# Altium integrated library ALTIUM-WR-FPC-rev18c.IntLib: 212 symbols (part 1 of 2)
Pins are listed as number, name and electrical type; pins without a type are passive.

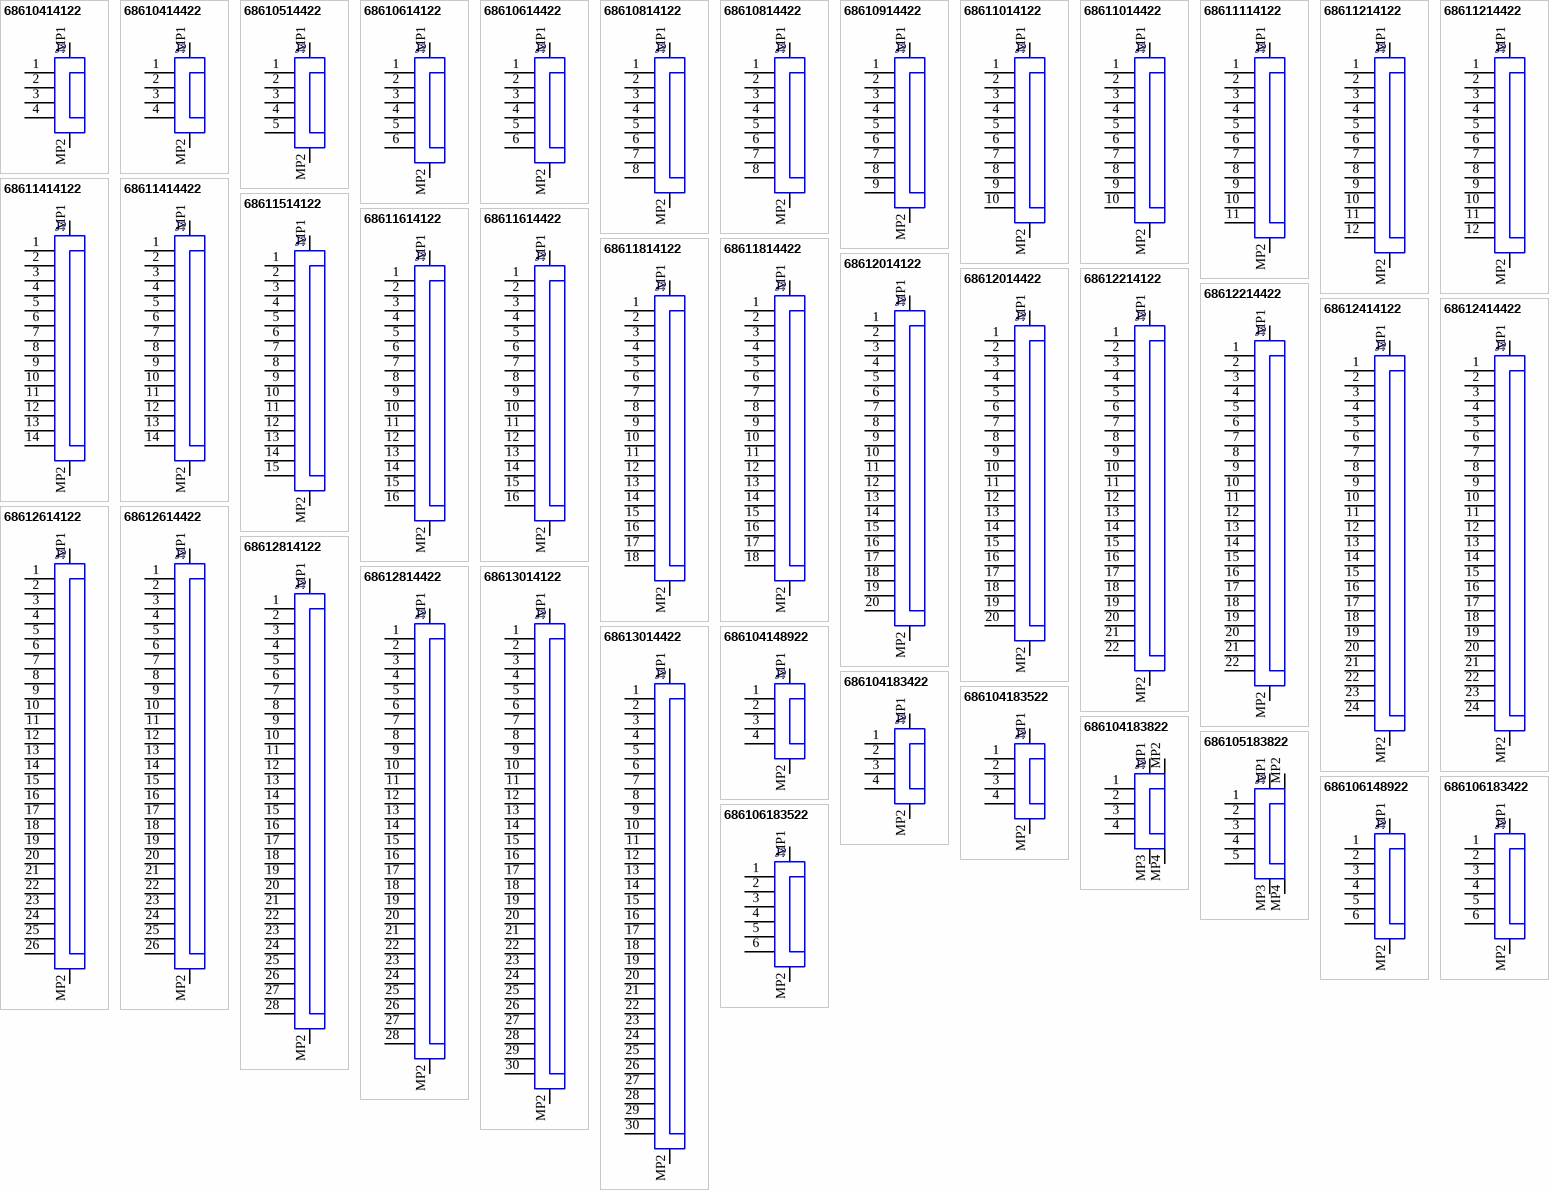
[diagram p0: symbols 68610414122 to 686106183522]

## 68610414122
designator J?
SMT ZIF Connectors WR-FPC, Horizontal, Top Contact, pitch 1 mm, 4 pins; Part Number: 68610414122; Rated Current: 1 A; Contact Resistance: 20 mOhm; Withstanding Voltage: 500 VAC; Working Voltage: 125 VAC; Pin Number: 4; Pitch: 1 mm; ComponentLink1Description: Manufacturer; ComponentLink1URL: http://www.we-online.de; ComponentLink2Description: Datasheet; ComponentLink2URL: https://katalog.we-online.de/em/datasheet/68610414122.pdf; Published Date: August 2018; Publisher: Wurth Elektronik; Operating Temperature: -25 to 85 degC; Packaging: Tape and Reel; Mounting Technology: SMT; Orientation: Horizontal; Contact Design: Top Contact
footprint 68610414122
pins: 1, 2, 3, 4, MP1, MP2

## 68610414422
designator J?
SMT ZIF Connectors WR-FPC, Horizontal, Bottom Contact, pitch 1 mm, 4 pins; Part Number: 68610414422; Rated Current: 1 A; Contact Resistance: 20 mOhm; Withstanding Voltage: 500 VAC; Working Voltage: 125 VAC; Pin Number: 4; Pitch: 1 mm; ComponentLink1Description: Manufacturer; ComponentLink1URL: http://www.we-online.de; ComponentLink2Description: Datasheet; ComponentLink2URL: https://katalog.we-online.de/em/datasheet/68610414422.pdf; Published Date: August 2018; Publisher: Wurth Elektronik; Operating Temperature: -25 to 85 degC; Packaging: Tape and Reel; Mounting Technology: SMT; Orientation: Horizontal; Contact Design: Bottom Contact
footprint 68610414422
pins: 1, 2, 3, 4, MP1, MP2

## 68610514422
designator J?
SMT ZIF Connectors WR-FPC, Horizontal, Bottom Contact, pitch 1 mm, 5 pins; Part Number: 68610514422; Rated Current: 1 A; Contact Resistance: 20 mOhm; Withstanding Voltage: 500 VAC; Working Voltage: 125 VAC; Pin Number: 5; Pitch: 1 mm; ComponentLink1Description: Manufacturer; ComponentLink1URL: http://www.we-online.de; ComponentLink2Description: Datasheet; ComponentLink2URL: https://katalog.we-online.de/em/datasheet/68610514422.pdf; Published Date: August 2018; Publisher: Wurth Elektronik; Operating Temperature: -25 to 85 degC; Packaging: Tape and Reel; Mounting Technology: SMT; Orientation: Horizontal; Contact Design: Bottom Contact
footprint 68610514422
pins: 1, 2, 3, 4, 5, MP1, MP2

## 68610614122
designator J?
SMT ZIF Connectors WR-FPC, Horizontal, Top Contact, pitch 1 mm, 6 pins; Part Number: 68610614122; Rated Current: 1 A; Contact Resistance: 20 mOhm; Withstanding Voltage: 500 VAC; Working Voltage: 125 VAC; Pin Number: 6; Pitch: 1 mm; ComponentLink1Description: Manufacturer; ComponentLink1URL: http://www.we-online.de; ComponentLink2Description: Datasheet; ComponentLink2URL: https://katalog.we-online.de/em/datasheet/68610614122.pdf; Published Date: August 2018; Publisher: Wurth Elektronik; Operating Temperature: -25 to 85 degC; Packaging: Tape and Reel; Mounting Technology: SMT; Orientation: Horizontal; Contact Design: Top Contact
footprint 68610614122
pins: 1, 2, 3, 4, 5, 6, MP1, MP2

## 68610614422
designator J?
SMT ZIF Connectors WR-FPC, Horizontal, Bottom Contact, pitch 1 mm, 6 pins; Part Number: 68610614422; Rated Current: 1 A; Contact Resistance: 20 mOhm; Withstanding Voltage: 500 VAC; Working Voltage: 125 VAC; Pin Number: 6; Pitch: 1 mm; ComponentLink1Description: Manufacturer; ComponentLink1URL: http://www.we-online.de; ComponentLink2Description: Datasheet; ComponentLink2URL: https://katalog.we-online.de/em/datasheet/68610614422.pdf; Published Date: August 2018; Publisher: Wurth Elektronik; Operating Temperature: -25 to 85 degC; Packaging: Tape and Reel; Mounting Technology: SMT; Orientation: Horizontal; Contact Design: Bottom Contact
footprint 68610614422
pins: 1, 2, 3, 4, 5, 6, MP1, MP2

## 68610814122
designator J?
SMT ZIF Connectors WR-FPC, Horizontal, Top Contact, pitch 1 mm, 8 pins; Part Number: 68610814122; Rated Current: 1 A; Contact Resistance: 20 mOhm; Withstanding Voltage: 500 VAC; Working Voltage: 125 VAC; Pin Number: 8; Pitch: 1 mm; ComponentLink1Description: Manufacturer; ComponentLink1URL: http://www.we-online.de; ComponentLink2Description: Datasheet; ComponentLink2URL: https://katalog.we-online.de/em/datasheet/68610814122.pdf; Published Date: August 2018; Publisher: Wurth Elektronik; Operating Temperature: -25 to 85 degC; Packaging: Tape and Reel; Mounting Technology: SMT; Orientation: Horizontal; Contact Design: Top Contact
footprint 68610814122
pins: 1, 2, 3, 4, 5, 6, 7, 8, MP1, MP2

## 68610814422
designator J?
SMT ZIF Connectors WR-FPC, Horizontal, Bottom Contact, pitch 1 mm, 8 pins; Part Number: 68610814422; Rated Current: 1 A; Contact Resistance: 20 mOhm; Withstanding Voltage: 500 VAC; Working Voltage: 125 VAC; Pin Number: 8; Pitch: 1 mm; ComponentLink1Description: Manufacturer; ComponentLink1URL: http://www.we-online.de; ComponentLink2Description: Datasheet; ComponentLink2URL: https://katalog.we-online.de/em/datasheet/68610814422.pdf; Published Date: August 2018; Publisher: Wurth Elektronik; Operating Temperature: -25 to 85 degC; Packaging: Tape and Reel; Mounting Technology: SMT; Orientation: Horizontal; Contact Design: Bottom Contact
footprint 68610814422
pins: 1, 2, 3, 4, 5, 6, 7, 8, MP1, MP2

## 68610914422
designator J?
SMT ZIF Connectors WR-FPC, Horizontal, Bottom Contact, pitch 1 mm, 9 pins; Part Number: 68610914422; Rated Current: 1 A; Contact Resistance: 20 mOhm; Withstanding Voltage: 500 VAC; Working Voltage: 125 VAC; Pin Number: 9; Pitch: 1 mm; ComponentLink1Description: Manufacturer; ComponentLink1URL: http://www.we-online.de; ComponentLink2Description: Datasheet; ComponentLink2URL: https://katalog.we-online.de/em/datasheet/68610914422.pdf; Published Date: August 2018; Publisher: Wurth Elektronik; Operating Temperature: -25 to 85 degC; Packaging: Tape and Reel; Mounting Technology: SMT; Orientation: Horizontal; Contact Design: Bottom Contact
footprint 68610914422
pins: 1, 2, 3, 4, 5, 6, 7, 8, 9, MP1, MP2

## 68611014122
designator J?
SMT ZIF Connectors WR-FPC, Horizontal, Top Contact, pitch 1 mm, 10 pins; Part Number: 68611014122; Rated Current: 1 A; Contact Resistance: 20 mOhm; Withstanding Voltage: 500 VAC; Working Voltage: 125 VAC; Pin Number: 10; Pitch: 1 mm; ComponentLink1Description: Manufacturer; ComponentLink1URL: http://www.we-online.de; ComponentLink2Description: Datasheet; ComponentLink2URL: https://katalog.we-online.de/em/datasheet/68611014122.pdf; Published Date: August 2018; Publisher: Wurth Elektronik; Operating Temperature: -25 to 85 degC; Packaging: Tape and Reel; Mounting Technology: SMT; Orientation: Horizontal; Contact Design: Top Contact
footprint 68611014122
pins: 1, 2, 3, 4, 5, 6, 7, 8, 9, 10, MP1, MP2

## 68611014422
designator J?
SMT ZIF Connectors WR-FPC, Horizontal, Bottom Contact, pitch 1 mm, 10 pins; Part Number: 68611014422; Rated Current: 1 A; Contact Resistance: 20 mOhm; Withstanding Voltage: 500 VAC; Working Voltage: 125 VAC; Pin Number: 10; Pitch: 1 mm; ComponentLink1Description: Manufacturer; ComponentLink1URL: http://www.we-online.de; ComponentLink2Description: Datasheet; ComponentLink2URL: https://katalog.we-online.de/em/datasheet/68611014422.pdf; Published Date: August 2018; Publisher: Wurth Elektronik; Operating Temperature: -25 to 85 degC; Packaging: Tape and Reel; Mounting Technology: SMT; Orientation: Horizontal; Contact Design: Bottom Contact
footprint 68611014422
pins: 1, 2, 3, 4, 5, 6, 7, 8, 9, 10, MP1, MP2

## 68611114122
designator J?
SMT ZIF Connectors WR-FPC, Horizontal, Top Contact, pitch 1 mm, 11 pins; Part Number: 68611114122; Rated Current: 1 A; Contact Resistance: 20 mOhm; Withstanding Voltage: 500 VAC; Working Voltage: 125 VAC; Pin Number: 11; Pitch: 1 mm; ComponentLink1Description: Manufacturer; ComponentLink1URL: http://www.we-online.de; ComponentLink2Description: Datasheet; ComponentLink2URL: https://katalog.we-online.de/em/datasheet/68611114122.pdf; Published Date: August 2018; Publisher: Wurth Elektronik; Operating Temperature: -25 to 85 degC; Packaging: Tape and Reel; Mounting Technology: SMT; Orientation: Horizontal; Contact Design: Top Contact
footprint 68611114122
pins: 1, 2, 3, 4, 5, 6, 7, 8, 9, 10, 11, MP1, MP2

## 68611214122
designator J?
SMT ZIF Connectors WR-FPC, Horizontal, Top Contact, pitch 1 mm, 12 pins; Part Number: 68611214122; Rated Current: 1 A; Contact Resistance: 20 mOhm; Withstanding Voltage: 500 VAC; Working Voltage: 125 VAC; Pin Number: 12; Pitch: 1 mm; ComponentLink1Description: Manufacturer; ComponentLink1URL: http://www.we-online.de; ComponentLink2Description: Datasheet; ComponentLink2URL: https://katalog.we-online.de/em/datasheet/68611214122.pdf; Published Date: August 2018; Publisher: Wurth Elektronik; Operating Temperature: -25 to 85 degC; Packaging: Tape and Reel; Mounting Technology: SMT; Orientation: Horizontal; Contact Design: Top Contact
footprint 68611214122
pins: 1, 2, 3, 4, 5, 6, 7, 8, 9, 10, 11, 12, MP1, MP2

## 68611214422
designator J?
SMT ZIF Connectors WR-FPC, Horizontal, Bottom Contact, pitch 1 mm, 12 pins; Part Number: 68611214422; Rated Current: 1 A; Contact Resistance: 20 mOhm; Withstanding Voltage: 500 VAC; Working Voltage: 125 VAC; Pin Number: 12; Pitch: 1 mm; ComponentLink1Description: Manufacturer; ComponentLink1URL: http://www.we-online.de; ComponentLink2Description: Datasheet; ComponentLink2URL: https://katalog.we-online.de/em/datasheet/68611214422.pdf; Published Date: August 2018; Publisher: Wurth Elektronik; Operating Temperature: -25 to 85 degC; Packaging: Tape and Reel; Mounting Technology: SMT; Orientation: Horizontal; Contact Design: Bottom Contact
footprint 68611214422
pins: 1, 2, 3, 4, 5, 6, 7, 8, 9, 10, 11, 12, MP1, MP2

## 68611414122
designator J?
SMT ZIF Connectors WR-FPC, Horizontal, Top Contact, pitch 1 mm, 14 pins; Part Number: 68611414122; Rated Current: 1 A; Contact Resistance: 20 mOhm; Withstanding Voltage: 500 VAC; Working Voltage: 125 VAC; Pin Number: 14; Pitch: 1 mm; ComponentLink1Description: Manufacturer; ComponentLink1URL: http://www.we-online.de; ComponentLink2Description: Datasheet; ComponentLink2URL: https://katalog.we-online.de/em/datasheet/68611414122.pdf; Published Date: August 2018; Publisher: Wurth Elektronik; Operating Temperature: -25 to 85 degC; Packaging: Tape and Reel; Mounting Technology: SMT; Orientation: Horizontal; Contact Design: Top Contact
footprint 68611414122
pins: 1, 2, 3, 4, 5, 6, 7, 8, 9, 10, 11, 12, 13, 14, MP1, MP2

## 68611414422
designator J?
SMT ZIF Connectors WR-FPC, Horizontal, Bottom Contact, pitch 1 mm, 14 pins; Part Number: 68611414422; Rated Current: 1 A; Contact Resistance: 20 mOhm; Withstanding Voltage: 500 VAC; Working Voltage: 125 VAC; Pin Number: 14; Pitch: 1 mm; ComponentLink1Description: Manufacturer; ComponentLink1URL: http://www.we-online.de; ComponentLink2Description: Datasheet; ComponentLink2URL: https://katalog.we-online.de/em/datasheet/68611414422.pdf; Published Date: August 2018; Publisher: Wurth Elektronik; Operating Temperature: -25 to 85 degC; Packaging: Tape and Reel; Mounting Technology: SMT; Orientation: Horizontal; Contact Design: Bottom Contact
footprint 68611414422
pins: 1, 2, 3, 4, 5, 6, 7, 8, 9, 10, 11, 12, 13, 14, MP1, MP2

## 68611514122
designator J?
SMT ZIF Connectors WR-FPC, Horizontal, Top Contact, pitch 1 mm, 15 pins; Part Number: 68611514122; Rated Current: 1 A; Contact Resistance: 20 mOhm; Withstanding Voltage: 500 VAC; Working Voltage: 125 VAC; Pin Number: 15; Pitch: 1 mm; ComponentLink1Description: Manufacturer; ComponentLink1URL: http://www.we-online.de; ComponentLink2Description: Datasheet; ComponentLink2URL: https://katalog.we-online.de/em/datasheet/68611514122.pdf; Published Date: August 2018; Publisher: Wurth Elektronik; Operating Temperature: -25 to 85 degC; Packaging: Tape and Reel; Mounting Technology: SMT; Orientation: Horizontal; Contact Design: Top Contact
footprint 68611514122
pins: 1, 2, 3, 4, 5, 6, 7, 8, 9, 10, 11, 12, 13, 14, 15, MP1, MP2

## 68611614122
designator J?
SMT ZIF Connectors WR-FPC, Horizontal, Top Contact, pitch 1 mm, 16 pins; Part Number: 68611614122; Rated Current: 1 A; Contact Resistance: 20 mOhm; Withstanding Voltage: 500 VAC; Working Voltage: 125 VAC; Pin Number: 16; Pitch: 1 mm; ComponentLink1Description: Manufacturer; ComponentLink1URL: http://www.we-online.de; ComponentLink2Description: Datasheet; ComponentLink2URL: https://katalog.we-online.de/em/datasheet/68611614122.pdf; Published Date: August 2018; Publisher: Wurth Elektronik; Operating Temperature: -25 to 85 degC; Packaging: Tape and Reel; Mounting Technology: SMT; Orientation: Horizontal; Contact Design: Top Contact
footprint 68611614122
pins: 1, 2, 3, 4, 5, 6, 7, 8, 9, 10, 11, 12, 13, 14, 15, 16, MP1, MP2

## 68611614422
designator J?
SMT ZIF Connectors WR-FPC, Horizontal, Bottom Contact, pitch 1 mm, 16 pins; Part Number: 68611614422; Rated Current: 1 A; Contact Resistance: 20 mOhm; Withstanding Voltage: 500 VAC; Working Voltage: 125 VAC; Pin Number: 16; Pitch: 1 mm; ComponentLink1Description: Manufacturer; ComponentLink1URL: http://www.we-online.de; ComponentLink2Description: Datasheet; ComponentLink2URL: https://katalog.we-online.de/em/datasheet/68611614422.pdf; Published Date: August 2018; Publisher: Wurth Elektronik; Operating Temperature: -25 to 85 degC; Packaging: Tape and Reel; Mounting Technology: SMT; Orientation: Horizontal; Contact Design: Bottom Contact
footprint 68611614422
pins: 1, 2, 3, 4, 5, 6, 7, 8, 9, 10, 11, 12, 13, 14, 15, 16, MP1, MP2

## 68611814122
designator J?
SMT ZIF Connectors WR-FPC, Horizontal, Top Contact, pitch 1 mm, 18 pins; Part Number: 68611814122; Rated Current: 1 A; Contact Resistance: 20 mOhm; Withstanding Voltage: 500 VAC; Working Voltage: 125 VAC; Pin Number: 18; Pitch: 1 mm; ComponentLink1Description: Manufacturer; ComponentLink1URL: http://www.we-online.de; ComponentLink2Description: Datasheet; ComponentLink2URL: https://katalog.we-online.de/em/datasheet/68611814122.pdf; Published Date: August 2018; Publisher: Wurth Elektronik; Operating Temperature: -25 to 85 degC; Packaging: Tape and Reel; Mounting Technology: SMT; Orientation: Horizontal; Contact Design: Top Contact
footprint 68611814122
pins: 1, 2, 3, 4, 5, 6, 7, 8, 9, 10, 11, 12, 13, 14, 15, 16, 17, 18, MP1, MP2

## 68611814422
designator J?
SMT ZIF Connectors WR-FPC, Horizontal, Bottom Contact, pitch 1 mm, 18 pins; Part Number: 68611814422; Rated Current: 1 A; Contact Resistance: 20 mOhm; Withstanding Voltage: 500 VAC; Working Voltage: 125 VAC; Pin Number: 18; Pitch: 1 mm; ComponentLink1Description: Manufacturer; ComponentLink1URL: http://www.we-online.de; ComponentLink2Description: Datasheet; ComponentLink2URL: https://katalog.we-online.de/em/datasheet/68611814422.pdf; Published Date: August 2018; Publisher: Wurth Elektronik; Operating Temperature: -25 to 85 degC; Packaging: Tape and Reel; Mounting Technology: SMT; Orientation: Horizontal; Contact Design: Bottom Contact
footprint 68611814422
pins: 1, 2, 3, 4, 5, 6, 7, 8, 9, 10, 11, 12, 13, 14, 15, 16, 17, 18, MP1, MP2

## 68612014122
designator J?
SMT ZIF Connectors WR-FPC, Horizontal, Top Contact, pitch 1 mm, 20 pins; Part Number: 68612014122; Rated Current: 1 A; Contact Resistance: 20 mOhm; Withstanding Voltage: 500 VAC; Working Voltage: 125 VAC; Pin Number: 20; Pitch: 1 mm; ComponentLink1Description: Manufacturer; ComponentLink1URL: http://www.we-online.de; ComponentLink2Description: Datasheet; ComponentLink2URL: https://katalog.we-online.de/em/datasheet/68612014122.pdf; Published Date: August 2018; Publisher: Wurth Elektronik; Operating Temperature: -25 to 85 degC; Packaging: Tape and Reel; Mounting Technology: SMT; Orientation: Horizontal; Contact Design: Top Contact
footprint 68612014122
pins: 1, 2, 3, 4, 5, 6, 7, 8, 9, 10, 11, 12, 13, 14, 15, 16, 17, 18, 19, 20, MP1, MP2

## 68612014422
designator J?
SMT ZIF Connectors WR-FPC, Horizontal, Bottom Contact, pitch 1 mm, 20 pins; Part Number: 68612014422; Rated Current: 1 A; Contact Resistance: 20 mOhm; Withstanding Voltage: 500 VAC; Working Voltage: 125 VAC; Pin Number: 20; Pitch: 1 mm; ComponentLink1Description: Manufacturer; ComponentLink1URL: http://www.we-online.de; ComponentLink2Description: Datasheet; ComponentLink2URL: https://katalog.we-online.de/em/datasheet/68612014422.pdf; Published Date: August 2018; Publisher: Wurth Elektronik; Operating Temperature: -25 to 85 degC; Packaging: Tape and Reel; Mounting Technology: SMT; Orientation: Horizontal; Contact Design: Bottom Contact
footprint 68612014422
pins: 1, 2, 3, 4, 5, 6, 7, 8, 9, 10, 11, 12, 13, 14, 15, 16, 17, 18, 19, 20, MP1, MP2

## 68612214122
designator J?
SMT ZIF Connectors WR-FPC, Horizontal, Top Contact, pitch 1 mm, 22 pins; Part Number: 68612214122; Rated Current: 1 A; Contact Resistance: 20 mOhm; Withstanding Voltage: 500 VAC; Working Voltage: 125 VAC; Pin Number: 22; Pitch: 1 mm; ComponentLink1Description: Manufacturer; ComponentLink1URL: http://www.we-online.de; ComponentLink2Description: Datasheet; ComponentLink2URL: https://katalog.we-online.de/em/datasheet/68612214122.pdf; Published Date: August 2018; Publisher: Wurth Elektronik; Operating Temperature: -25 to 85 degC; Packaging: Tape and Reel; Mounting Technology: SMT; Orientation: Horizontal; Contact Design: Top Contact
footprint 68612214122
pins: 1, 2, 3, 4, 5, 6, 7, 8, 9, 10, 11, 12, 13, 14, 15, 16, 17, 18, 19, 20, 21, 22, MP1, MP2

## 68612214422
designator J?
SMT ZIF Connectors WR-FPC, Horizontal, Bottom Contact, pitch 1 mm, 22 pins; Part Number: 68612214422; Rated Current: 1 A; Contact Resistance: 20 mOhm; Withstanding Voltage: 500 VAC; Working Voltage: 125 VAC; Pin Number: 22; Pitch: 1 mm; ComponentLink1Description: Manufacturer; ComponentLink1URL: http://www.we-online.de; ComponentLink2Description: Datasheet; ComponentLink2URL: https://katalog.we-online.de/em/datasheet/68612214422.pdf; Published Date: August 2018; Publisher: Wurth Elektronik; Operating Temperature: -25 to 85 degC; Packaging: Tape and Reel; Mounting Technology: SMT; Orientation: Horizontal; Contact Design: Bottom Contact
footprint 68612214422
pins: 1, 2, 3, 4, 5, 6, 7, 8, 9, 10, 11, 12, 13, 14, 15, 16, 17, 18, 19, 20, 21, 22, MP1, MP2

## 68612414122
designator J?
SMT ZIF Connectors WR-FPC, Horizontal, Top Contact, pitch 1 mm, 24 pins; Part Number: 68612414122; Rated Current: 1 A; Contact Resistance: 20 mOhm; Withstanding Voltage: 500 VAC; Working Voltage: 125 VAC; Pin Number: 24; Pitch: 1 mm; ComponentLink1Description: Manufacturer; ComponentLink1URL: http://www.we-online.de; ComponentLink2Description: Datasheet; ComponentLink2URL: https://katalog.we-online.de/em/datasheet/68612414122.pdf; Published Date: August 2018; Publisher: Wurth Elektronik; Operating Temperature: -25 to 85 degC; Packaging: Tape and Reel; Mounting Technology: SMT; Orientation: Horizontal; Contact Design: Top Contact
footprint 68612414122
pins: 1, 2, 3, 4, 5, 6, 7, 8, 9, 10, 11, 12, 13, 14, 15, 16, 17, 18, 19, 20, 21, 22, 23, 24, MP1, MP2

## 68612414422
designator J?
SMT ZIF Connectors WR-FPC, Horizontal, Bottom Contact, pitch 1 mm, 24 pins; Part Number: 68612414422; Rated Current: 1 A; Contact Resistance: 20 mOhm; Withstanding Voltage: 500 VAC; Working Voltage: 125 VAC; Pin Number: 24; Pitch: 1 mm; ComponentLink1Description: Manufacturer; ComponentLink1URL: http://www.we-online.de; ComponentLink2Description: Datasheet; ComponentLink2URL: https://katalog.we-online.de/em/datasheet/68612414422.pdf; Published Date: August 2018; Publisher: Wurth Elektronik; Operating Temperature: -25 to 85 degC; Packaging: Tape and Reel; Mounting Technology: SMT; Orientation: Horizontal; Contact Design: Bottom Contact
footprint 68612414422
pins: 1, 2, 3, 4, 5, 6, 7, 8, 9, 10, 11, 12, 13, 14, 15, 16, 17, 18, 19, 20, 21, 22, 23, 24, MP1, MP2

## 68612614122
designator J?
SMT ZIF Connectors WR-FPC, Horizontal, Top Contact, pitch 1 mm, 26 pins; Part Number: 68612614122; Rated Current: 1 A; Contact Resistance: 20 mOhm; Withstanding Voltage: 500 VAC; Working Voltage: 125 VAC; Pin Number: 26; Pitch: 1 mm; ComponentLink1Description: Manufacturer; ComponentLink1URL: http://www.we-online.de; ComponentLink2Description: Datasheet; ComponentLink2URL: https://katalog.we-online.de/em/datasheet/68612614122.pdf; Published Date: August 2018; Publisher: Wurth Elektronik; Operating Temperature: -25 to 85 degC; Packaging: Tape and Reel; Mounting Technology: SMT; Orientation: Horizontal; Contact Design: Top Contact
footprint 68612614122
pins: 1, 2, 3, 4, 5, 6, 7, 8, 9, 10, 11, 12, 13, 14, 15, 16, 17, 18, 19, 20, 21, 22, 23, 24, 25, 26, MP1, MP2

## 68612614422
designator J?
SMT ZIF Connectors WR-FPC, Horizontal, Bottom Contact, pitch 1 mm, 26 pins; Part Number: 68612614422; Rated Current: 1 A; Contact Resistance: 20 mOhm; Withstanding Voltage: 500 VAC; Working Voltage: 125 VAC; Pin Number: 26; Pitch: 1 mm; ComponentLink1Description: Manufacturer; ComponentLink1URL: http://www.we-online.de; ComponentLink2Description: Datasheet; ComponentLink2URL: https://katalog.we-online.de/em/datasheet/68612614422.pdf; Published Date: August 2018; Publisher: Wurth Elektronik; Operating Temperature: -25 to 85 degC; Packaging: Tape and Reel; Mounting Technology: SMT; Orientation: Horizontal; Contact Design: Bottom Contact
footprint 68612614422
pins: 1, 2, 3, 4, 5, 6, 7, 8, 9, 10, 11, 12, 13, 14, 15, 16, 17, 18, 19, 20, 21, 22, 23, 24, 25, 26, MP1, MP2

## 68612814122
designator J?
SMT ZIF Connectors WR-FPC, Horizontal, Top Contact, pitch 1 mm, 28 pins; Part Number: 68612814122; Rated Current: 1 A; Contact Resistance: 20 mOhm; Withstanding Voltage: 500 VAC; Working Voltage: 125 VAC; Pin Number: 28; Pitch: 1 mm; ComponentLink1Description: Manufacturer; ComponentLink1URL: http://www.we-online.de; ComponentLink2Description: Datasheet; ComponentLink2URL: https://katalog.we-online.de/em/datasheet/68612814122.pdf; Published Date: August 2018; Publisher: Wurth Elektronik; Operating Temperature: -25 to 85 degC; Packaging: Tape and Reel; Mounting Technology: SMT; Orientation: Horizontal; Contact Design: Top Contact
footprint 68612814122
pins: 1, 2, 3, 4, 5, 6, 7, 8, 9, 10, 11, 12, 13, 14, 15, 16, 17, 18, 19, 20, 21, 22, 23, 24, 25, 26, 27, 28, MP1, MP2

## 68612814422
designator J?
SMT ZIF Connectors WR-FPC, Horizontal, Bottom Contact, pitch 1 mm, 28 pins; Part Number: 68612814422; Rated Current: 1 A; Contact Resistance: 20 mOhm; Withstanding Voltage: 500 VAC; Working Voltage: 125 VAC; Pin Number: 28; Pitch: 1 mm; ComponentLink1Description: Manufacturer; ComponentLink1URL: http://www.we-online.de; ComponentLink2Description: Datasheet; ComponentLink2URL: https://katalog.we-online.de/em/datasheet/68612814422.pdf; Published Date: August 2018; Publisher: Wurth Elektronik; Operating Temperature: -25 to 85 degC; Packaging: Tape and Reel; Mounting Technology: SMT; Orientation: Horizontal; Contact Design: Bottom Contact
footprint 68612814422
pins: 1, 2, 3, 4, 5, 6, 7, 8, 9, 10, 11, 12, 13, 14, 15, 16, 17, 18, 19, 20, 21, 22, 23, 24, 25, 26, 27, 28, MP1, MP2

## 68613014122
designator J?
SMT ZIF Connectors WR-FPC, Horizontal, Top Contact, pitch 1 mm, 30 pins; Part Number: 68613014122; Rated Current: 1 A; Contact Resistance: 20 mOhm; Withstanding Voltage: 500 VAC; Working Voltage: 125 VAC; Pin Number: 30; Pitch: 1 mm; ComponentLink1Description: Manufacturer; ComponentLink1URL: http://www.we-online.de; ComponentLink2Description: Datasheet; ComponentLink2URL: https://katalog.we-online.de/em/datasheet/68613014122.pdf; Published Date: August 2018; Publisher: Wurth Elektronik; Operating Temperature: -25 to 85 degC; Packaging: Tape and Reel; Mounting Technology: SMT; Orientation: Horizontal; Contact Design: Top Contact
footprint 68613014122
pins: 1, 2, 3, 4, 5, 6, 7, 8, 9, 10, 11, 12, 13, 14, 15, 16, 17, 18, 19, 20, 21, 22, 23, 24, 25, 26, 27, 28, 29, 30, MP1, MP2

## 68613014422
designator J?
SMT ZIF Connectors WR-FPC, Horizontal, Bottom Contact, pitch 1 mm, 30 pins; Part Number: 68613014422; Rated Current: 1 A; Contact Resistance: 20 mOhm; Withstanding Voltage: 500 VAC; Working Voltage: 125 VAC; Pin Number: 30; Pitch: 1 mm; ComponentLink1Description: Manufacturer; ComponentLink1URL: http://www.we-online.de; ComponentLink2Description: Datasheet; ComponentLink2URL: https://katalog.we-online.de/em/datasheet/68613014422.pdf; Published Date: August 2018; Publisher: Wurth Elektronik; Operating Temperature: -25 to 85 degC; Packaging: Tape and Reel; Mounting Technology: SMT; Orientation: Horizontal; Contact Design: Bottom Contact
footprint 68613014422
pins: 1, 2, 3, 4, 5, 6, 7, 8, 9, 10, 11, 12, 13, 14, 15, 16, 17, 18, 19, 20, 21, 22, 23, 24, 25, 26, 27, 28, 29, 30, MP1, MP2

## 686104148922
designator J?
SMT ZIF Connectors Hinge Type WR-FPC, Horizontal, Bottom Contact, pitch 1 mm, 4 pins; Part Number: 686104148922; Rated Current: 1 A; Contact Resistance: 50 mOhm; Withstanding Voltage: 500 VAC; Working Voltage: 100 VAC; Pin Number: 4; Pitch: 1 mm; ComponentLink1Description: Manufacturer; ComponentLink1URL: http://www.we-online.de; ComponentLink2Description: Datasheet; ComponentLink2URL: https://katalog.we-online.de/em/datasheet/686104148922.pdf; Published Date: August 2018; Publisher: Wurth Elektronik; Operating Temperature: -40 to 105 degC; Packaging: Tape and Reel; Mounting Technology: SMT; Orientation: Horizontal; Contact Design: Bottom Contact
footprint 686104148922
pins: 1, 2, 3, 4, MP1, MP2

## 686104183422
designator J?
SMT ZIF Connectors Low Profile WR-FPC, Horizontal, Top Contact, pitch 1 mm, 4 pins; Part Number: 686104183422; Rated Current: 0.8 A; Contact Resistance: 30 mOhm; Withstanding Voltage: 250 VAC; Working Voltage: 50 VAC; Pin Number: 4; Pitch: 1 mm; ComponentLink1Description: Manufacturer; ComponentLink1URL: http://www.we-online.de; ComponentLink2Description: Datasheet; ComponentLink2URL: https://katalog.we-online.de/em/datasheet/686104183422.pdf; Published Date: August 2018; Publisher: Wurth Elektronik; Operating Temperature: -25 to 85 degC; Packaging: Tape and Reel; Mounting Technology: SMT; Orientation: Horizontal; Contact Design: Top Contact
footprint 686104183422
pins: 1, 2, 3, 4, MP1, MP2

## 686104183522
designator J?
SMT ZIF Connectors Low Profile WR-FPC, Horizontal, Bottom Contact, pitch 1 mm, 4 pins; Part Number: 686104183522; Rated Current: 0.8 A; Contact Resistance: 30 mOhm; Withstanding Voltage: 250 VAC; Working Voltage: 50 VAC; Pin Number: 4; Pitch: 1 mm; ComponentLink1Description: Manufacturer; ComponentLink1URL: http://www.we-online.de; ComponentLink2Description: Datasheet; ComponentLink2URL: https://katalog.we-online.de/em/datasheet/686104183522.pdf; Published Date: August 2018; Publisher: Wurth Elektronik; Operating Temperature: -25 to 85 degC; Packaging: Tape and Reel; Mounting Technology: SMT; Orientation: Horizontal; Contact Design: Bottom Contact
footprint 686104183522
pins: 1, 2, 3, 4, MP1, MP2

## 686104183822
designator J?